# Altium footprint library AltiumLibrary.PcbLib: 127 footprints (part 2 of 8)
Each footprint in its own frame and in the unit in brackets; x right, y up, seen from the top. Pads: shape width x height; smd on the part's side, far side on the other; paste and mask are expansions set on the pad; w line width, h text height; cw(c..) or ccw(c..) is an arc to the next point about the centre after c.
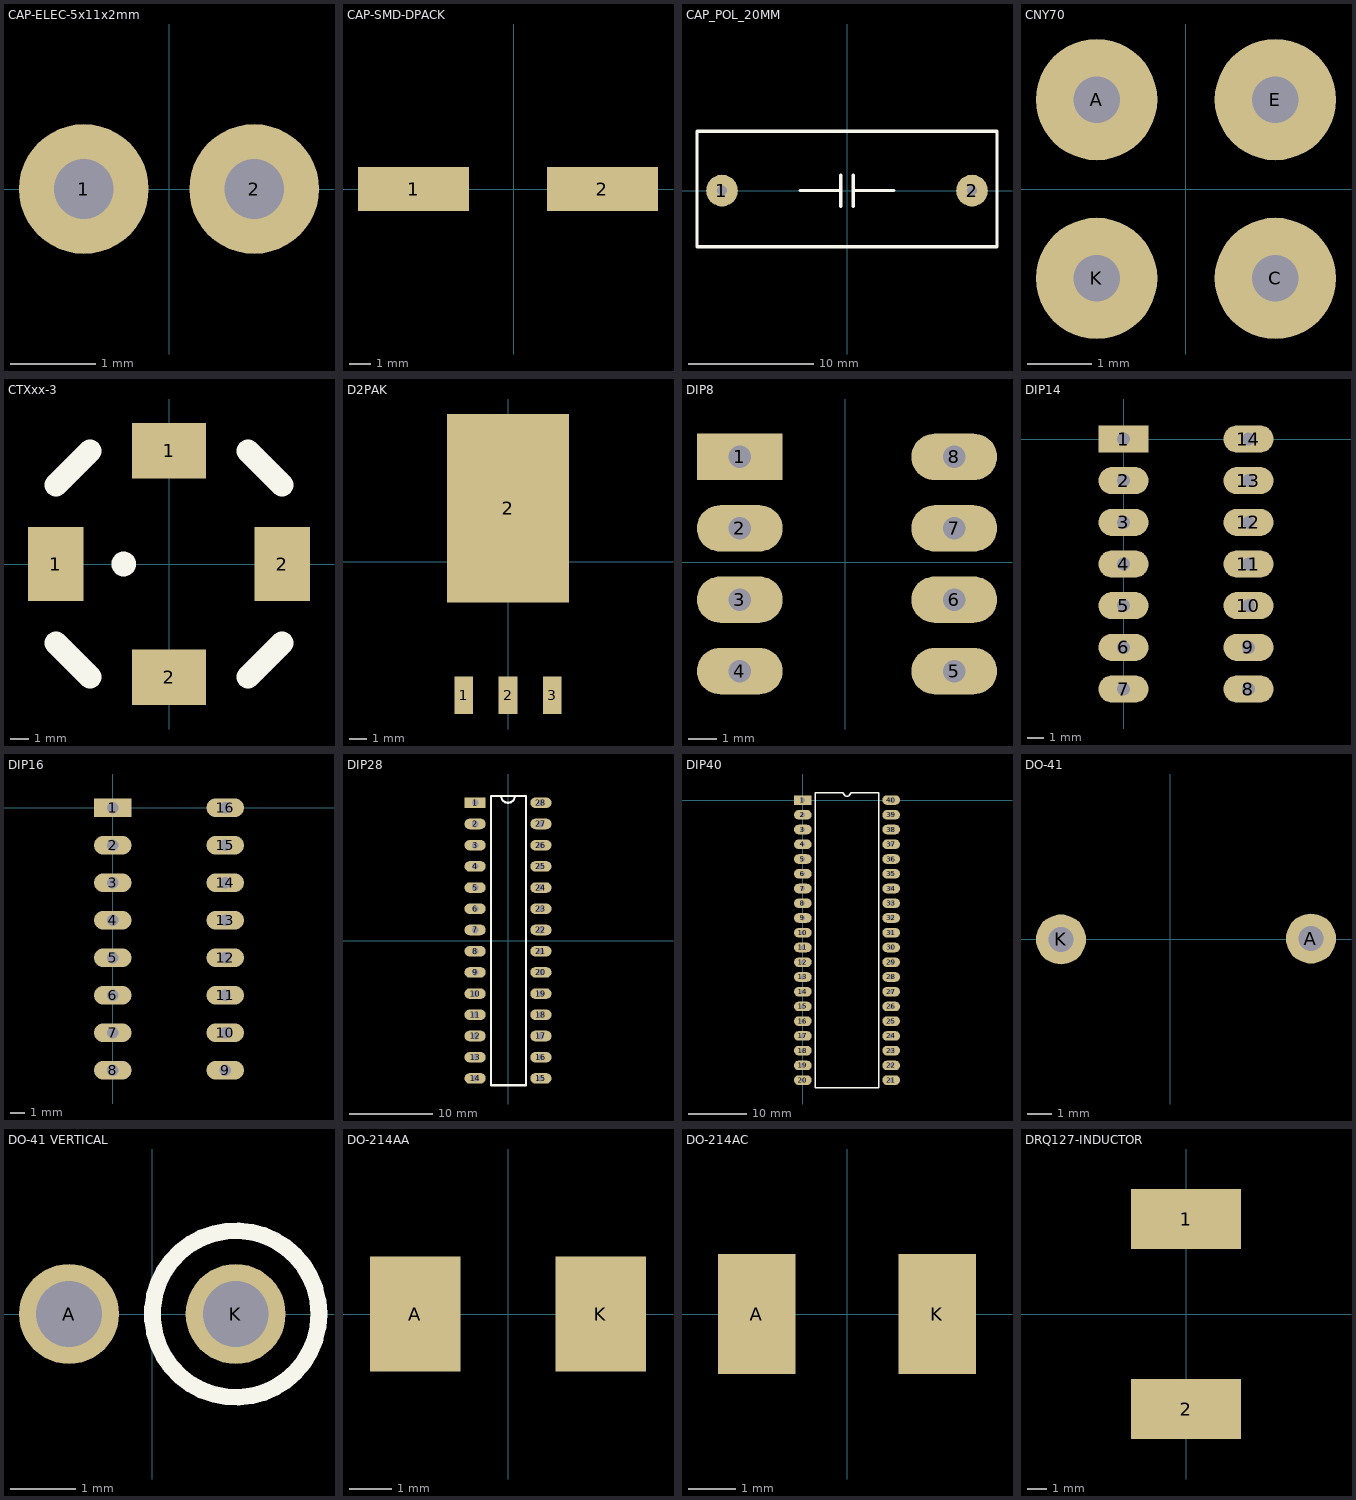
[diagram p1: the footprints below, top view; thin cyan lines are the x and y axes]

## CAP-ELEC-5x11x2mm [mil]
pads (2):
  round 60 hole 27.56: 1(-39.37,0) 2(39.37,0)
3D body "User Library-Cap electro 5x11x2mm.step": height 453.76, standoff -128.81, extent -99.65,-99.42 99.19,99.43

## CAP-SMD-DPACK [mil]
pads (2):
  rect 200x80 smd: 1(-180,0) 2(160,0)
3D body "User Library-ALU-D.STEP": height 222.6, standoff 10, extent -145.59,-124.92 130,134.92

## CAP_POL_20MM [mm]
pads (2):
  round 2.54 hole 0.8: 1(-10,0) 2(10,0)
Top Overlay:
  lines w0.254: -3.75,0 -0.5,0 ; -0.5,-1.25 -0.5,1.25 ; 0.5,-1.25 0.5,1.25 ; 0.5,0 3.75,0 ; -12,-4.5 12,-4.5 12,4.75 -12,4.75 -12,-4.5

## CNY70 [mm]
pads (4):
  round 1.9 hole 0.73: A(-1.395,1.405) C(1.405,-1.395) E(1.405,1.405) K(-1.395,-1.395)
3D body "User Library-cny70.step": height 6, standoff -5, extent -3.495,-3.762 3.505,3.205

## CTXxx-3 [mm]
pads (4):
  rect 3.05x4.06 smd: 1(-6.25,0) 2(6.25,0)
  rect 4.06x3.05 smd: 1(0,6.25) 2(0,-6.25)
Top Overlay:
  circle w0.762: c-2.5,0 r0.3
  lines w1.27: -6.25,-4.35 -4.35,-6.25 ; -6.25,4.35 -4.35,6.25 ; 4.35,-6.25 6.25,-4.35 ; 4.35,6.25 6.25,4.35

## D2PAK [mil]
pads (4):
  rect 42x85 smd: 1(-100,-300.25) 2(0,-300.25) 3(100,-300.25)
  rect 275x425 smd: 2(0,120.25)
3D body "User Library-TO263-3-1.STEP": height 181.1, standoff -1.14, extent -204.45,-320 205,304.02

## DIP8 [mm]
pads (8):
  rect 3.048x1.651 hole 0.8: 1(-3.75,3.75)
  oval 3.048x1.651 hole 0.8: 2(-3.75,1.21) 3(-3.75,-1.33) 4(-3.75,-3.87) 5(3.87,-3.87) 6(3.87,-1.33) 7(3.87,1.21) 8(3.87,3.75)
3D body "DIP8.SLDPRT": height 3.94, standoff -3.36, extent -3.875,-4.96 3.995,4.84

## DIP14 [mil]
pads (14):
  rect 120x65 hole 31.5: 1(0,0)
  oval 120x65 hole 31.5: 2(0,-100) 3(0,-200) 4(0,-300) 5(0,-400) 6(0,-500) 7(0,-600) 8(300,-600) 9(300,-500) 10(300,-400) 11(300,-300) 12(300,-200) 13(300,-100) 14(300,0)
3D body "CircuitWorks-DIP-14.step": height 159.45, standoff -115.35, extent -7.48,-675 307.48,75

## DIP16 [mm]
pads (16):
  rect 2.54x1.27 hole 0.8: 1(0,0)
  oval 2.54x1.27 hole 0.8: 2(0,-2.54) 3(0,-5.08) 4(0,-7.62) 5(0,-10.16) 6(0,-12.7) 7(0,-15.24) 8(0,-17.78) 9(7.62,-17.78) 10(7.62,-15.24) 11(7.62,-12.7) 12(7.62,-10.16) 13(7.62,-7.62) 14(7.62,-5.08) 15(7.62,-2.54) 16(7.62,0)
3D body "CircuitWorks-DIP 16 IC.step": height 5.1, standoff -3.3, extent -0.125,-18.89 7.745,1.11

## DIP28 [mil]
pads (28):
  rect 100x50 hole 31.5: 1(-155,650)
  oval 100x50 hole 31.5: 2(-155,550) 3(-155,450) 4(-155,350) 5(-155,250) 6(-155,150) 7(-155,50) 8(-155,-50) 9(-155,-150) 10(-155,-250) 11(-155,-350) 12(-155,-450) 13(-155,-550) 14(-155,-650) 15(155,-650) 16(155,-550) 17(155,-450) 18(155,-350) 19(155,-250) 20(155,-150) 21(155,-50) 22(155,50) 23(155,150) 24(155,250) 25(155,350) 26(155,450) 27(155,550) 28(155,650)
Top Overlay:
  lines w10: -32.5,682.5 ccw(c0,682.5) 32.5,682.5 ; -80,-682.5 -80,682.5 85,682.5 85,-682.5 -80,-682.5
3D body "User Library-User Library-ATmega 48_88_168_328 28P3_90DEG.step": height 200.22, standoff -80.14, extent -155.63,-682.08 155.63,682.09

## DIP40 [mil]
pads (40):
  rect 120x65 hole 31.5: 1(0,0)
  oval 120x65 hole 31.5: 2(0,-100) 3(0,-200) 4(0,-300) 5(0,-400) 6(0,-500) 7(0,-600) 8(0,-700) 9(0,-800) 10(0,-900) 11(0,-1000) 12(0,-1100) 13(0,-1200) 14(0,-1300) 15(0,-1400) 16(0,-1500) 17(0,-1600) 18(0,-1700) 19(0,-1800) 20(0,-1900) 21(600,-1900) 22(600,-1800) 23(600,-1700) 24(600,-1600) 25(600,-1500) 26(600,-1400) 27(600,-1300) 28(600,-1200) 29(600,-1100) 30(600,-1000) 31(600,-900) 32(600,-800) 33(600,-700) 34(600,-600) 35(600,-500) 36(600,-400) 37(600,-300) 38(600,-200) 39(600,-100) 40(600,0)
Top Overlay:
  lines w10: 85,-1950 85,50 275,50 ccw(c300,50) 325,50 515,50 515,-1950 85,-1950
3D body "User Library-DIP40-600-with-chip-Type2.step": height 317.08, standoff -122.29, extent -48.46,-1979 644.46,78.48

## DO-41 [mil]
pads (2):
  round 80 hole 39.37: A(224.99,1.45) K(-175,0)
3D body "User Library-DO-41-2.step": height 107.09, standoff -102.36, extent -192.01,-52.08 242.01,55

## DO-41 VERTICAL [mil]
pads (2):
  round 60 hole 39.37: A(-50,0) K(50,0)
Top Overlay:
  circle w10: c50,0 r50
3D body "DO-41 Vertical (1).step": height 379.22, standoff -177.17, extent -66.62,-53.32 103.49,53.64

## DO-214AA [mil]
pads (2):
  rect 85x108 smd: A(-87,0) K(87,0)
3D body "User Library-DIOM5539X24.step": height 96.46, standoff 1.09, extent -108.27,-76.77 108.27,76.77

## DO-214AC [mil]
pads (2):
  rect 65x100 smd: A(-75.39,0) K(75.39,0)
3D body "User Library-DO-214AC(SMA).step": height 90, standoff 0, extent -107.99,-54.99 108.01,55

## DRQ127-INDUCTOR [mil]
pads (2):
  rect 220x120 smd: 1(0,190) 2(0,-190)
3D body "User Library-DRQ127_12_5x12_5.step": height 310.28, standoff -4.68, extent -246.06,-246.06 246.06,246.07